# Altium footprint library M_Derogarian Altium Library.PcbLib: 137 footprints (part 3 of 9)
Each footprint in its own frame and in the unit in brackets; x right, y up, seen from the top. Pads: shape width x height; smd on the part's side, far side on the other; paste and mask are expansions set on the pad; w line width, h text height; cw(c..) or ccw(c..) is an arc to the next point about the centre after c.
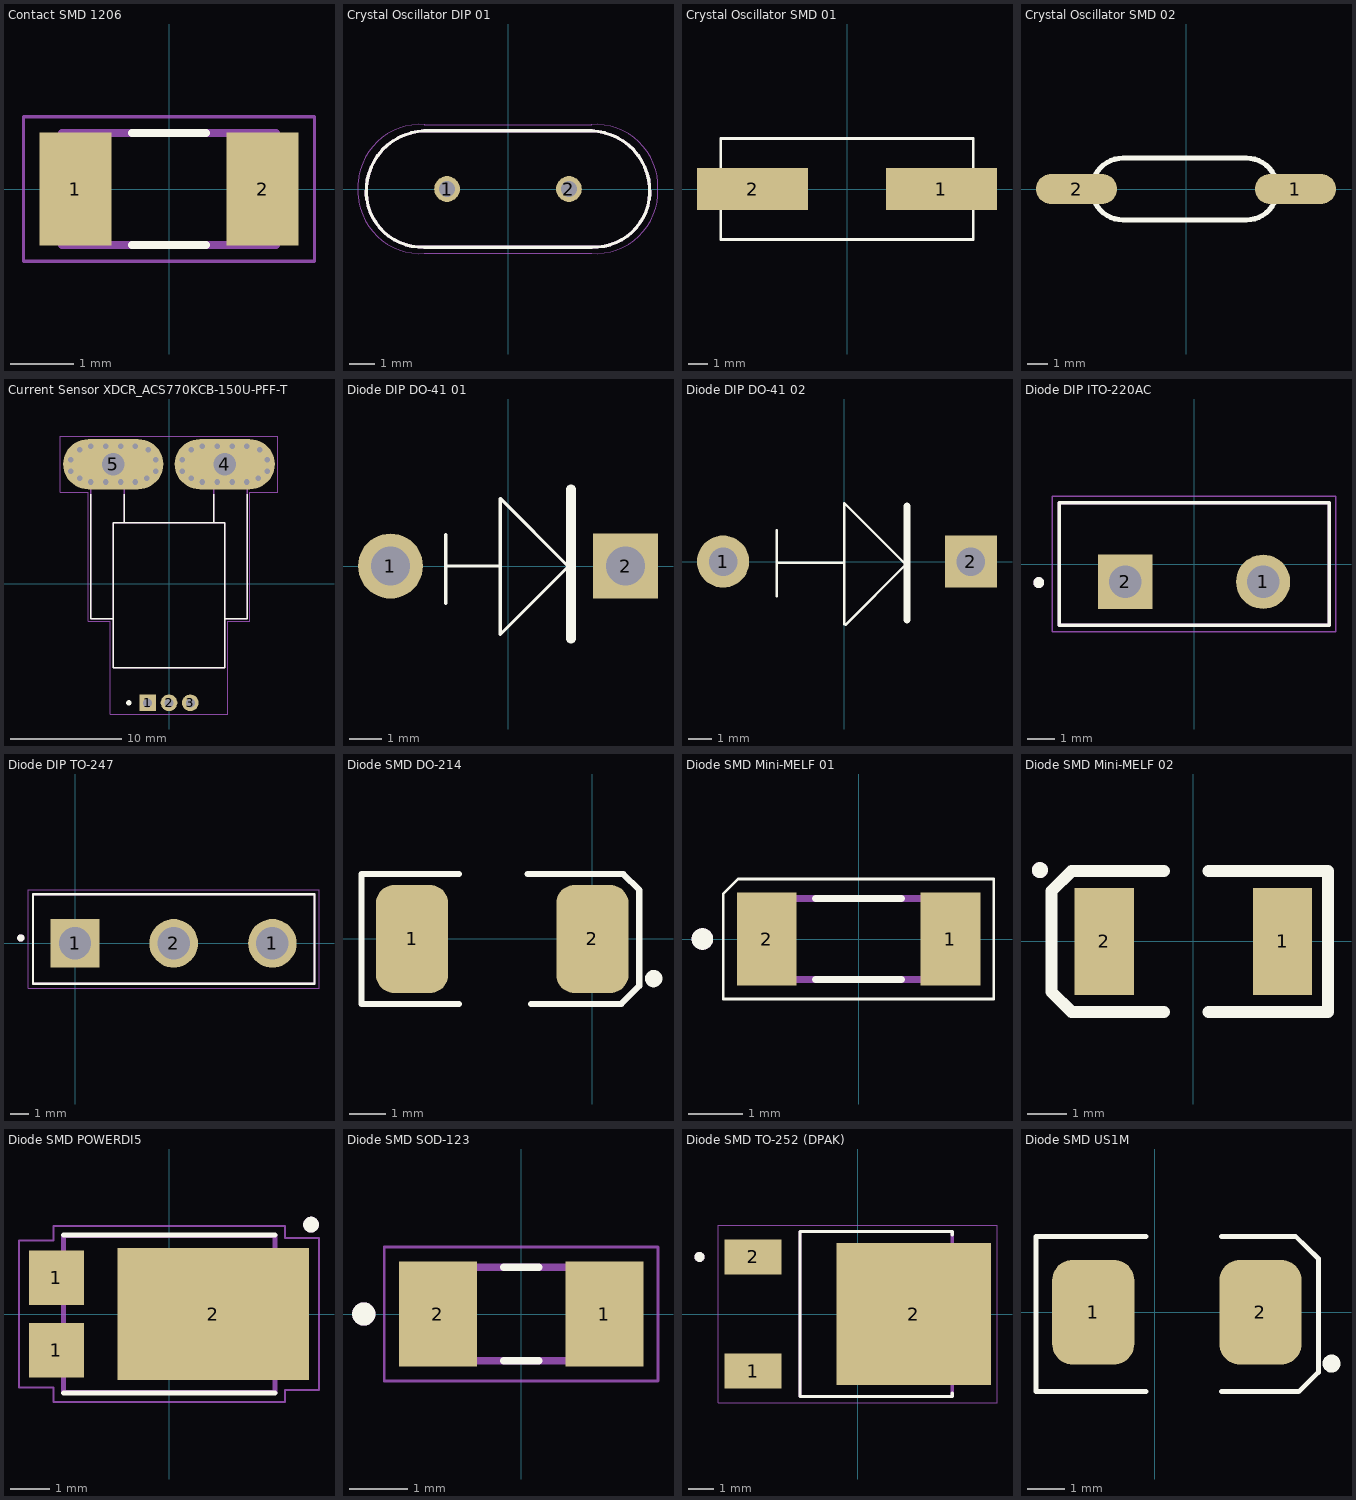
[diagram p2: the footprints below, top view; thin cyan lines are the x and y axes]

## Contact SMD 1206 [mm]
pads (2):
  rect 1.13x1.77 smd: 1(-1.47,0) 2(1.47,0)
Top Overlay:
  lines w0.127: -0.58,-0.88 0.58,-0.88 ; -0.58,0.88 0.58,0.88
Mechanical 13:
  lines w0.127: -1.68,-0.88 -1.68,0.88 1.68,0.88 1.68,-0.88 -1.68,-0.88
Mechanical 15:
  lines w0.05: -2.285,-1.135 -2.285,1.135 2.285,1.135 2.285,-1.135 -2.285,-1.135
3D body "User Library-RESC3216X06N.STEP": height 0.55, standoff 0, extent -1.625,-0.774 1.575,0.826

## Crystal Oscillator DIP 01 [mm]
pads (2):
  round 1.03 hole 0.63: 1(-2.44,0) 2(2.44,0)
Top Overlay:
  lines w0.127: -5.675,-0.169 cw(c-3.26,-0.085) -3.344,2.33 ; -5.675,-0.168 ccw(c-3.435,-0.09) -3.357,-2.33 ; -3.35,-2.33 3.35,-2.33 ; -3.35,2.33 3.35,2.33 ; 3.344,2.33 cw(c3.26,-0.085) 5.675,-0.169 ; 3.357,-2.33 ccw(c3.435,-0.09) 5.675,-0.168
Mechanical 13:
  lines w0.127: -5.675,-0.169 cw(c-3.26,-0.085) -3.344,2.33 ; -5.675,-0.168 ccw(c-3.435,-0.09) -3.357,-2.33 ; -3.35,-2.33 3.35,-2.33 ; -3.35,2.33 3.35,2.33 ; 3.344,2.33 cw(c3.26,-0.085) 5.675,-0.169 ; 3.357,-2.33 ccw(c3.435,-0.09) 5.675,-0.168
Mechanical 15:
  lines w0.05: -5.999,-0.264 ccw(c-3.51,-0.09) -3.336,-2.579 ; -6,-0.25 -6,0.25 ; -5.999,0.264 cw(c-3.51,0.09) -3.336,2.579 ; -3.35,-2.58 3.35,-2.58 ; -3.35,2.58 3.35,2.58 ; 3.336,-2.579 ccw(c3.51,-0.09) 5.999,-0.264 ; 3.336,2.579 cw(c3.51,0.09) 5.999,0.264 ; 6,-0.25 6,0.25
3D body "ECS-80-18-1X.STEP": height 15.46, standoff -10.7, extent -5.75,-2.5 5.6,2.5

## Crystal Oscillator SMD 01 [mil]
pads (2):
  rect 220x83 smd: 1(187,0) 2(-187,0)
Top Overlay:
  lines w5: -250,-100 -250,100 250,100 250,-100 -250,-100
3D body "ABLS-8.000MHZ-B4-T--3DModel-STEP-400430.STEP": height 160, standoff -4, extent -246,-91 254,94

## Crystal Oscillator SMD 02 [mm]
pads (2):
  oval 4x1.5 smd: 1(5.397,0) 2(-5.397,0)
Top Overlay:
  lines w0.254: -3.112,-1.524 cw(c-3.111,0) -3.111,1.524 2.984,1.524 cw(c2.984,0) 2.984,-1.524 -2.603,-1.524 -3.111,-1.524
3D body "User Library-HC49_Crystal_SM.STEP": height 4.5, standoff -0.01, extent -7.053,-2.5 6.848,2.5

## Current Sensor XDCR_ACS770KCB-150U-PFF-T [mm]
pads (37):
  rect 1.5x1.5 hole 0.8: 1(-1.91,-10.7)
  round 1.5 hole 0.8: 2(0,-10.7) 3(1.91,-10.7)
  oval 9x4.5 hole 2: 4(5,10.7) 5(-5,10.7)
  round 0.8 hole 0.5: 4_1(3,9.1) 4_2(4.33,9.1) 4_3(5.66,9.1) 4_4(6.99,9.1) 4_5(8,9.43) 4_6(8.8,10.05) 4_7(8.8,11.1) 4_8(8.15,12) 4_9(6.99,12.3) 4_10(5.66,12.3) 4_11(4.33,12.3) 4_12(3,12.3) 4_13(2,12) 4_14(1.2,11.1) 4_15(1.2,10.05) 4_16(2,9.43) 5_1(-7,9.1) 5_2(-5.67,9.1) 5_3(-4.34,9.1) 5_4(-3.01,9.1) 5_5(-8,9.43) 5_6(-8.8,10.05) 5_7(-8.8,11.1) 5_8(-8,12) 5_9(-7,12.3) 5_10(-5.67,12.3) 5_11(-4.34,12.3) 5_12(-3.01,12.3) 5_13(-1.85,12) 5_14(-1.2,11.1) 5_15(-1.2,10.05) 5_16(-2,9.43)
Top Overlay:
  circle w0.24: c-3.6,-10.7 r0.12
  lines w0.127: -7,8 -7,-3.15 -5,-3.15 ; -4,8 -4,5.45 ; 4,8 4,5.45 ; 7,8 7,-3.15 5,-3.15 ; -5,-3.15 -5,-7.55 5,-7.55 5,-3.15 ; -5,-3.15 -5,5.45 -4,5.45 ; -4,5.45 4,5.45 ; 4,5.45 5,5.45 5,-3.15
Mechanical 1:
  lines w0: -5,11.7 -4.95,11.7 ; 5,11.7 5.05,11.7 ; -7,9.7 cw(c-7,10.7) -7,11.7 -3,11.7 cw(c-3,10.7) -3,9.7 -7,9.7 ; 3,9.7 cw(c3,10.7) 3,11.7 7,11.7 cw(c7,10.7) 7,9.7 3,9.7
Mechanical 13:
  lines w0.127: -5,-3.15 -5,-7.55 5,-7.55 5,-3.15 ; -5,-3.15 -5,5.45 -4,5.45 ; -5,-3.15 -7,-3.15 -7,11.45 -4,11.45 -4,5.45 ; -4,5.45 4,5.45 ; 4,5.45 5,5.45 5,-3.15 ; 4,5.45 4,11.45 7,11.45 7,-3.15 5,-3.15
Mechanical 15:
  lines w0.05: -9.75,8.2 -7.25,8.2 -7.25,-3.4 -5.25,-3.4 -5.25,-11.7 5.25,-11.7 5.25,-3.4 7.25,-3.4 7.25,8.2 9.75,8.2 9.75,13.2 -9.75,13.2 -9.75,8.2
3D body "ACS758LCB-100B-PFF-T--3DModel-STEP-56544.STEP": height 8, standoff -3.7, extent -7.127,-11.179 6.873,11.424

## Diode DIP DO-41 01 [mm]
height 2.8
pads (2):
  round 2 hole 1.2: 1(-3.619,0)
  rect 2x2 hole 1.2: 2(3.619,0)
Top Overlay:
  lines w0.1: -1.918,-1.143 -1.918,0.965 ; -1.892,0 -0.298,0 ; -0.241,-2.108 -0.241,2.083 1.854,-0.013 -0.241,-2.108
  lines w0.3: 1.943,-2.235 1.943,2.362
3D body "User Library-1N4007 x7mm.STEP": height 3.81, standoff -1.4, extent -3.963,-1.426 3.836,1.194

## Diode DIP DO-41 02 [mm]
height 2.8
pads (2):
  round 2.2 hole 1.2: 1(-5.105,0)
  rect 2.2x2.2 hole 1.2: 2(5.334,0)
Top Overlay:
  lines w0.1: -2.845,-1.473 -2.845,1.321 ; -2.845,-0.051 0,-0.051 ; 0,-2.642 0,2.464 2.591,-0.127 0.051,-2.667
  lines w0.3: 2.642,-2.464 2.642,2.337
3D body "CircuitWorks-DIODE0_4.STEP": height 3.55, standoff -1.54, extent -5.334,-1.397 5.588,1.168

## Diode DIP ITO-220AC [mm]
pads (2):
  round 1.995 hole 1.2: 1(2.54,-0.655)
  rect 1.995x1.995 hole 1.2: 2(-2.54,-0.655)
Top Overlay:
  circle w0.2: c-5.725,-0.685 r0.1
  lines w0.127: -4.975,-2.25 4.975,-2.25 4.975,2.25 -4.975,2.25 -4.975,-2.25
Mechanical 13:
  circle w0.2: c-5.725,-0.685 r0.1
  lines w0.127: -4.975,-2.25 4.975,-2.25 4.975,2.25 -4.975,2.25 -4.975,-2.25
Mechanical 15:
  lines w0.05: -5.225,-2.5 5.225,-2.5 5.225,2.5 -5.225,2.5 -5.225,-2.5
3D body "SFAF1602G.STEP": height 19.6, standoff -9.7, extent -4.975,-2.087 4.975,2.413

## Diode DIP TO-247 [mm]
pads (3):
  rect 2.69x2.69 hole 1.79: 1(0,0)
  round 2.69 hole 1.79: 1(10.92,0) 2(5.46,0)
Top Overlay:
  circle w0.2: c-3,0.3 r0.1
  lines w0.127: -2.33,-2.235 -2.33,2.71 13.25,2.71 13.25,-2.235 -2.33,-2.235
Mechanical 13:
  circle w0.2: c-3,0.3 r0.1
  lines w0.127: -2.33,-2.235 -2.33,2.71 13.25,2.71 13.25,-2.235 -2.33,-2.235
Mechanical 15:
  lines w0.05: -2.58,-2.485 -2.58,2.965 13.5,2.965 13.5,-2.485 -2.58,-2.485
3D body "step_temp.STEP": height 30.1, standoff -5, extent -2.339,-2.485 13.261,2.515

## Diode SMD DO-214 [mm]
pads (2):
  rrect50% 2x3 smd: 1(-5,0) 2(0,0)
Top Overlay:
  circle w0.24: c1.7,-1.1 r0.12
  lines w0.17: -3.7,-1.8 -6.4,-1.8 -6.4,1.8 -3.7,1.8 ; -1.8,1.8 0.625,1.8 0.863,1.8 1.3,1.363 1.3,-1.1 ; -1.7,-1.8 0.8,-1.8 1.3,-1.3 1.3,-1
3D body "User Library-403A-03_rotated.STEP": height 2.36, standoff 0.05, extent -5.42,-1.68 0.02,1.88

## Diode SMD Mini-MELF 01 [mm]
pads (2):
  rect 1.11x1.73 smd: 1(1.705,0) 2(-1.705,0)
Top Overlay:
  circle w0.2: c-2.9,0 r0.1
  lines w0.05: -2.51,-1.115 -2.51,0.843 -2.238,1.115 2.51,1.115 2.51,-1.115 -2.51,-1.115
  lines w0.127: -0.8,-0.75 0.8,-0.75 ; -0.8,0.75 0.8,0.75
Mechanical 13:
  circle w0.2: c-2.9,0 r0.1
  lines w0.127: -1.75,-0.75 -1.75,0.75 1.75,0.75 1.75,-0.75 -1.75,-0.75
3D body "BZT55B22 L0G.STEP": height 1.6, standoff 0, extent -1.725,-0.775 1.775,0.825

## Diode SMD Mini-MELF 02 [mm]
pads (2):
  rect 1.5x2.7 smd: 1(2.25,0) 2(-2.25,0)
Top Overlay:
  circle w0.2: c-3.879,1.803 r0.1
  lines w0.305: -3.592,1.2 -3.592,-1.27 -3.084,-1.778 -0.75,-1.778 ; -3.592,1.27 -3.084,1.778 -0.75,1.778 ; 0.381,-1.778 3.393,-1.778 3.393,1.778 0.381,1.778
Mechanical 13:
  circle w0.2: c-3.879,1.803 r0.1
3D body "User Library-MELF.STEP": height 2.34, standoff -0.14, extent -2.33,-1.2 2.67,1.3

## Diode SMD POWERDI5 [mm]
pads (3):
  rect 1.4x1.39 smd: 1(-2.862,-0.92) 1(-2.862,0.92)
  rect 4.86x3.36 smd: 2(1.12,0)
Top Overlay:
  circle w0.2: c3.599,2.268 r0.1
  lines w0.127: -2.685,-2 2.685,-2 ; -2.685,2 2.685,2
Mechanical 13:
  circle w0.2: c3.599,2.268 r0.1
  lines w0.127: -2.685,-1.987 2.685,-1.987 2.685,1.987 -2.685,1.987 -2.685,-1.987
Mechanical 15:
  lines w0.05: -3.812,-1.865 -2.935,-1.865 -2.935,-2.238 2.935,-2.238 2.935,-1.93 3.8,-1.93 3.8,1.93 2.935,1.93 2.935,2.238 -2.935,2.238 -2.935,1.865 -3.812,1.865 -3.812,-1.865
3D body "User Library-PowerDI-5.STEP": height 1.12, standoff -0.03, extent -3.3,-2.05 3.3,2

## Diode SMD SOD-123 [mm]
pads (2):
  rect 1.34x1.8 smd: 1(1.43,0) 2(-1.43,0)
Top Overlay:
  circle w0.2: c-2.7,0 r0.1
  lines w0.127: -0.3,-0.8 0.3,-0.8 ; -0.3,0.8 0.3,0.8
Mechanical 13:
  circle w0.2: c-2.7,0 r0.1
  lines w0.127: -1.3,-0.8 1.3,-0.8 1.3,0.8 -1.3,0.8 -1.3,-0.8
Mechanical 15:
  lines w0.05: -2.35,-1.15 2.35,-1.15 2.35,1.15 -2.35,1.15 -2.35,-1.15
3D body "step_temp.STEP": height 1.15, standoff 0, extent -1.8,-0.8 1.8,0.8

## Diode SMD TO-252 (DPAK) [mm]
height 2.38
pads (3):
  rect 2.29x1.4 smd: 1(-4.19,-2.285) 2(-4.19,2.285)
  rect 6.18x5.69 smd paste-4: 2(2.245,0)
Top Overlay:
  circle w0.2: c-6.335,2.285 r0.1
  lines w0.127: 3.795,-3.165 3.795,-3.3 -2.305,-3.3 -2.305,3.3 3.795,3.3 3.795,3.165
Top Paste:
  region: 2.91,0.545 1.58,0.545 1.58,2.305 2.91,2.305
  region: 4.97,0.545 3.64,0.545 3.64,2.305 4.97,2.305
  region: 0.85,0.545 -0.48,0.545 -0.48,2.305 0.85,2.305
  region: 0.85,-2.305 -0.48,-2.305 -0.48,-0.545 0.85,-0.545
  region: 2.91,-2.305 1.58,-2.305 1.58,-0.545 2.91,-0.545
  region: 4.97,-2.305 3.64,-2.305 3.64,-0.545 4.97,-0.545
Mechanical 13:
  circle w0.2: c-6.335,2.285 r0.1
  lines w0.127: -2.305,-3.3 -2.305,3.3 3.795,3.3 3.795,-3.3 -2.305,-3.3
Mechanical 15:
  lines w0.05: -5.585,-3.55 -5.585,3.55 5.585,3.55 5.585,-3.55 -5.585,-3.55
3D body "step_temp.STEP": height 2.38, standoff -0.11, extent -4.95,-3.25 4.95,3.25

## Diode SMD US1M [mm]
pads (2):
  rrect50% 2.2x2.8 smd: 1(-1.645,0) 2(2.825,0)
Top Overlay:
  circle w0.24: c4.725,-1.375 r0.12
  lines w0.127: -0.225,-2.125 -3.175,-2.125 -3.175,2.025 -0.225,2.025 ; 1.775,-2.125 3.845,-2.125 4.375,-1.613 4.375,1.434 3.763,2.025 1.775,2.025
3D body "User Library-403A-03_rotated.STEP": height 2.31, standoff 0, extent -2.095,-1.935 3.345,1.625